# Altium footprint library First Board IMX6.PcbLib: 204 footprints (part 5 of 13)
Each footprint in its own frame and in the unit in brackets; x right, y up, seen from the top. Pads: shape width x height; smd on the part's side, far side on the other; paste and mask are expansions set on the pad; w line width, h text height; cw(c..) or ccw(c..) is an arc to the next point about the centre after c.
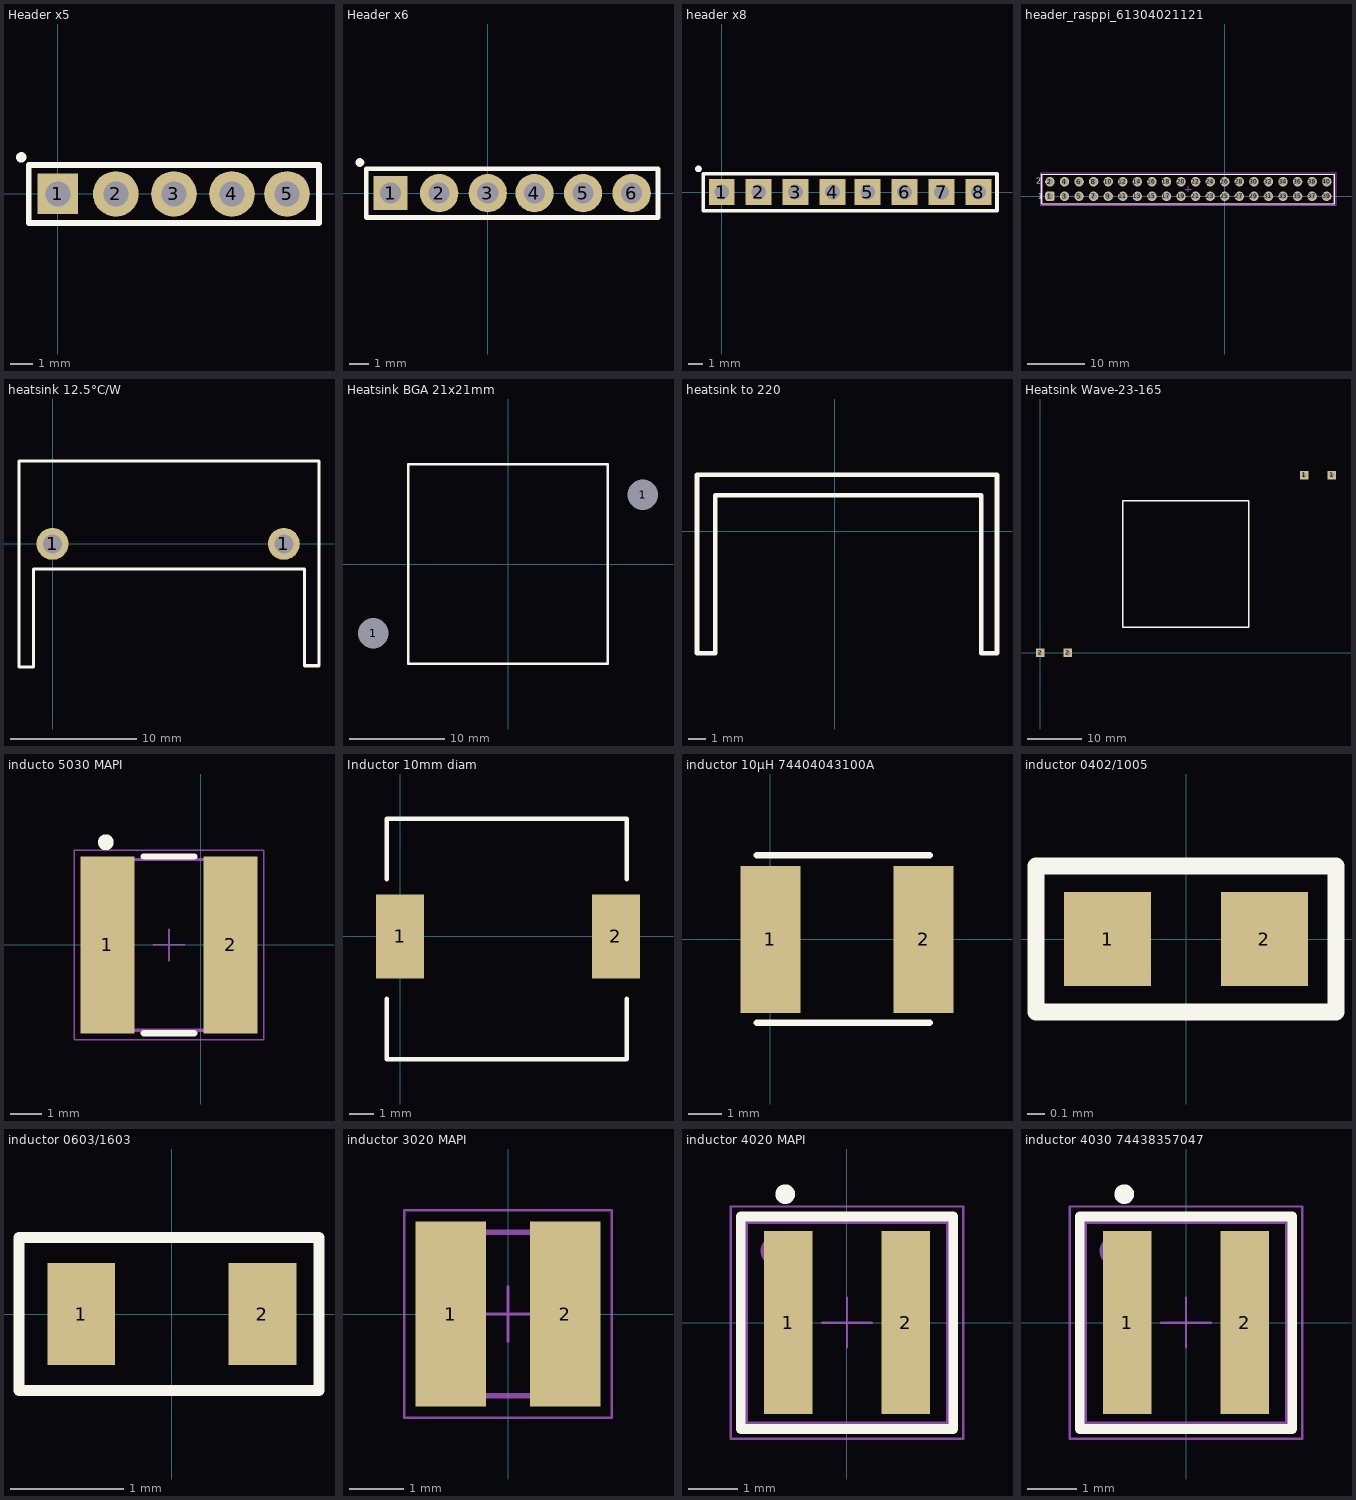
[diagram p4: the footprints below, top view; thin cyan lines are the x and y axes]

## Header x5 [mm]
pads (5):
  rect 1.778x1.778 hole 1.1: 1(0,0)
  round 2 hole 1.1: 2(2.54,0) 3(5.08,0) 4(7.62,0) 5(10.033,0)
Top Overlay:
  circle w0.254: c-1.6,1.6 r0.1
  lines w0.254: -1.27,-1.27 11.43,-1.27 11.43,1.27 -1.27,1.27 -1.27,-1.27
3D body "header male x5.step": height 5.99, standoff -2.89, extent -1.27,-1.27 11.43,1.27

## Header x6 [mm]
pads (6):
  rect 1.778x1.778 hole 1.1: 1(-5.075,0)
  round 2 hole 1.1: 2(-2.535,0) 3(0.005,0) 4(2.445,0) 5(4.985,0) 6(7.525,0)
Top Overlay:
  circle w0.254: c-6.675,1.6 r0.1
  lines w0.254: -6.345,-1.27 -6.345,1.27 8.9,1.27 8.9,-1.27 -6.345,-1.27
3D body "header male x3.step": height 5.94, standoff -2.94, extent -6.345,-1.27 1.275,1.27
3D body "header male x3.step": height 5.94, standoff -2.94, extent 1.175,-1.27 8.795,1.27

## header x8 [mil]
pads (8):
  rect 70x70 hole 40: 1(0,0) 2(100,0) 3(200,0) 4(300,0) 5(395,0) 6(495,0) 7(595,0) 8(695,0)
Top Overlay:
  circle w10: c-62.99,62.99 r3.94
  lines w10: 445,-50 745,-50 745,50 445,50 ; 450,-50 -50,-50 -50,50 450,50
3D body "header male x3.step": height 233.86, standoff -115.75, extent 450,-50 750,50
3D body "header male x5.step": height 235.86, standoff -113.75, extent -50,-50 450,50

## header_rasppi_61304021121 [mm]
pads (40):
  rrect50% 1.65x1.65 hole 1.1: 1(-30.48,0)
  round 1.65 hole 1.1: 2(-30.48,2.54) 3(-27.94,0) 4(-27.94,2.54) 5(-25.4,0) 6(-25.4,2.54) 7(-22.86,0) 8(-22.86,2.54) 9(-20.32,0) 10(-20.32,2.54) 11(-17.78,0) 12(-17.78,2.54) 13(-15.24,0) 14(-15.24,2.54) 15(-12.7,0) 16(-12.7,2.54) 17(-10.16,0) 18(-10.16,2.54) 19(-7.62,0) 20(-7.62,2.54) 21(-5.08,0) 22(-5.08,2.54) 23(-2.54,0) 24(-2.54,2.54) 25(0,0) 26(0,2.54) 27(2.54,0) 28(2.54,2.54) 29(5.08,0) 30(5.08,2.54) 31(7.62,0) 32(7.62,2.54) 33(10.16,0) 34(10.16,2.54) 35(12.7,0) 36(12.7,2.54) 37(15.24,0) 38(15.24,2.54) 39(17.78,0) 40(17.78,2.54)
Top Overlay:
  lines w0.2: -31.9,-1.345 19.2,-1.345 19.2,3.885 -31.9,3.885 -31.9,-1.345
  text "2" at -32.91,2.17 h1.02
  text "1" at -32.61,-0.53 h1.02
Top Assembly:
  lines w0.1: -31.75,-1.27 19.05,-1.27 19.05,3.81 -31.75,3.81 -31.75,-1.27
  text ".Designator" at -13.848,0.77 h1.5
Top Courtyard:
  lines w0.05: -6.85,1.27 -5.85,1.27 ; -6.35,0.77 -6.35,1.77 ; -32.1,-1.545 -32.1,4.085 19.4,4.085 19.4,-1.545 -32.1,-1.545
Top 3D Body:
  lines w0.1: -31.75,-1.27 19.05,-1.27 19.05,3.81 -31.75,3.81 -31.75,-1.27
3D body "header male x6_2.step": height 5.94, standoff -2.94, extent 6.365,-1.25 13.985,3.83
3D body "header male x6_2.step": height 5.94, standoff -2.94, extent -1.255,-1.25 6.365,3.83
3D body "header male x6_2.step": height 5.94, standoff -2.94, extent -8.875,-1.25 -1.255,3.83
3D body "header male x6_2.step": height 5.94, standoff -2.94, extent -16.495,-1.25 -8.875,3.83
3D body "header male x6_2.step": height 5.94, standoff -2.94, extent -24.115,-1.25 -16.495,3.83
3D body "header male x6_2.step": height 5.94, standoff -2.94, extent -31.735,-1.25 -24.115,3.83
3D body "header male x2.step": height 5.99, standoff -2.89, extent 13.97,1.27 19.05,3.81
3D body "header male x2.step": height 5.99, standoff -2.89, extent 13.97,-1.27 19.05,1.27

## heatsink 12.5°C/W [mil]
pads (2):
  round 100 hole 60: 1(0,0) 1(725,0)
Top Overlay:
  lines w10: -105,-385.83 -60,-385.83 -60,-78.74 790,-78.74 790,-381.89 835,-381.89 835,260 -105,260 -105,-385.83
3D body "Multiwatt 15 heatsink.STEP": height 984.25, standoff -157.48, extent -107.44,-369.92 837.44,260

## Heatsink BGA 21x21mm [mm]
pads (2):
  round 1.524 hole 3.2 mask+1.8: 1(-14.2,-7.3) 1(14.2,7.3)
Top Overlay:
  lines w0.254: -10.5,-10.5 10.5,-10.5 10.5,10.5 -10.5,10.5 -10.5,-10.5
3D body "21x21.960-21-15-S-AB-0.STEP": height 17.5, standoff -0.75, extent -17.804,-10.8 17.404,10.7

## heatsink to 220 [mm]
Top Overlay:
  lines w0.254: -7.747,-6.858 -6.731,-6.858 -6.731,2.032 8.255,2.032 8.255,-6.858 9.144,-6.858 9.144,3.175 -7.747,3.175 -7.747,-6.858
3D body "TO-220 Heatsink.step": height 20, standoff 0, extent -7.793,-6.858 9.207,3.142

## Heatsink Wave-23-165 [mm]
pads (4):
  rect 1.524x1.524 hole 0.9: 1(48.15,32.4) 1(53.2,32.4) 2(0,0) 2(5.05,0)
Top Overlay:
  lines w0.254: 15.075,4.7 38.075,4.7 38.075,27.7 15.075,27.7 15.075,4.7
3D body "Anchor_5.08mm.STEP": height 8.28, standoff -2.84, extent -1.211,-1.276 6.409,1.264
3D body "Anchor_5.08mm.STEP": height 8.28, standoff -2.84, extent 46.791,31.136 54.411,33.676

## inducto 5030 MAPI [mm]
pads (2):
  rect 1.7x5.6 smd: 1(-2.95,0) 2(0.95,0)
Top Overlay:
  circle w0.25: c-3,3.25 r0.125
  lines w0.2: -1.8,-2.8 -0.2,-2.8 ; -1.8,2.8 -0.2,2.8
Top Assembly:
  circle w0.1: c-2.9,1.9 r0.25
  lines w0.1: -3.7,-2.7 1.7,-2.7 1.7,2.7 -3.7,2.7 -3.7,-2.7
  text ".Designator" at -8.498,-0.5 h1.5
Top Courtyard:
  lines w0.05: -1.5,0 -0.5,0 ; -1,-0.5 -1,0.5 ; -4,-3 2,-3 2,3 -4,3 -4,-3
Top 3D Body:
  circle w0.1: c-2.9,1.9 r0.25
  lines w0.1: -3.7,-2.7 -3.7,2.7 1.7,2.7 1.7,-2.7 -3.7,-2.7
3D body "74438367xxx_5030.stp": height 3.1, standoff 0, extent -3.7,-2.7 1.7,2.7

## Inductor 10mm diam [mm]
pads (2):
  rect 2x3.5 smd: 1(0,0) 2(9,0)
Top Overlay:
  lines w0.2: -0.55,-2.6 -0.55,-5.125 9.45,-5.125 9.45,-2.6 ; -0.55,2.375 -0.55,4.9 9.45,4.9 9.45,2.375
3D body "inductor 10x10 mm70996799.stp": height 4.3, standoff -0.5, extent -0.55,-5.1 9.45,4.9

## inductor 10µH 74404043100A [mm]
pads (2):
  rect 1.8x4.4 smd: 1(0,0) 2(4.6,0)
Top Overlay:
  lines w0.2: -0.4,-2.5 4.775,-2.5 ; -0.4,2.525 4.775,2.525
3D body "SRN5040TA_series.step": height 4.1, standoff 0, extent -0.375,-2.455 4.825,2.455

## inductor 0402/1005 [mil]
pads (2):
  rect 20x21.65 smd mask+2.76: 1(-18,0) 2(18,0)
Top Overlay:
  lines w3.94: -34.45,-16.73 -34.45,16.73 34.45,16.73 34.45,-16.73 -34.45,-16.73
3D body "inductor_0402.stp": height 21.65, standoff 1.97, extent -19.68,-9.84 19.68,9.84

## inductor 0603/1603 [mm]
pads (2):
  rect 0.6x0.9 smd: 1(-0.8,0) 2(0.8,0)
Top Overlay:
  lines w0.1: -1.35,-0.675 -1.35,0.675 1.2,0.675 1.3,0.675 1.3,-0.675 -1.35,-0.675
3D body "inductor_0603.stp": height 0.8, standoff 0, extent -0.8,-0.4 0.8,0.4

## inductor 3020 MAPI [mm]
pads (2):
  rect 1.3x3.4 smd: 1(-1.05,0) 2(1.05,0)
Top Assembly:
  lines w0.1: -1.5,-1.5 1.5,-1.5 1.5,1.5 -1.5,1.5 -1.5,-1.5
  text ".Designator" at -4.998,-0.333 h1
Top Courtyard:
  lines w0.05: -0.5,0 0.5,0 ; 0,-0.5 0,0.5 ; -1.9,-1.9 -1.9,1.9 1.9,1.9 1.9,-1.9 -1.9,-1.9
Top 3D Body:
  lines w0.1: -1.5,-1.5 -1.5,1.5 1.5,1.5 1.5,-1.5 -1.5,-1.5
3D body "WE-IndMAPI_SSMC-30xx.stp": height 2, standoff 0, extent -1.5,-1.5 1.5,1.5

## inductor 4020 MAPI [mm]
pads (2):
  rect 0.98x3.7 smd: 1(-1.185,0) 2(1.185,0)
Top Overlay:
  circle w0.2: c-1.25,2.6 r0.1
  lines w0.2: -2.15,-2.15 2.15,-2.15 2.15,2.15 -2.15,2.15 -2.15,-2.15
Top Assembly:
  circle w0.1: c-1.45,1.45 r0.25
  lines w0.1: -2.05,-2.05 -2.05,2.05 2.05,2.05 2.05,-2.05 -2.05,-2.05
  text ".Designator" at -5.998,-0.4 h1.2
Top Courtyard:
  lines w0.05: -0.5,0 0.5,0 ; 0,-0.5 0,0.5 ; -2.35,-2.35 -2.35,2.35 2.35,2.35 2.35,-2.35 -2.35,-2.35
Top 3D Body:
  circle w0.1: c-1.45,1.45 r0.25
  lines w0.1: -2.05,-2.05 2.05,-2.05 2.05,2.05 -2.05,2.05 -2.05,-2.05
3D body "WE-IndMAPI_SSMC-4020.stp": height 2.1, standoff 0, extent -2.05,-2.05 2.05,2.05

## inductor 4030 74438357047 [mm]
pads (2):
  rect 0.98x3.7 smd: 1(-1.185,0) 2(1.185,0)
Top Overlay:
  circle w0.2: c-1.25,2.6 r0.1
  lines w0.2: -2.15,-2.15 2.15,-2.15 2.15,2.15 -2.15,2.15 -2.15,-2.15
Top Assembly:
  circle w0.1: c-1.45,1.45 r0.25
  lines w0.1: -2.05,-2.05 -2.05,2.05 2.05,2.05 2.05,-2.05 -2.05,-2.05
  text ".Designator" at -5.998,-0.4 h1.2
Top Courtyard:
  lines w0.05: -0.5,0 0.5,0 ; 0,-0.5 0,0.5 ; -2.35,-2.35 -2.35,2.35 2.35,2.35 2.35,-2.35 -2.35,-2.35
Top 3D Body:
  circle w0.1: c-1.45,1.45 r0.25
  lines w0.1: -2.05,-2.05 2.05,-2.05 2.05,2.05 -2.05,2.05 -2.05,-2.05
3D body "IndMAPI_4030_74438357xxx.stp": height 3.1, standoff 0, extent -2.05,-2.05 2.05,2.05